# Altium schematic symbol library Regulator_Linear.SchLib: 1538 symbols (part 5 of 9) (continued)
## LT1963AxQ-1.5 (continued)
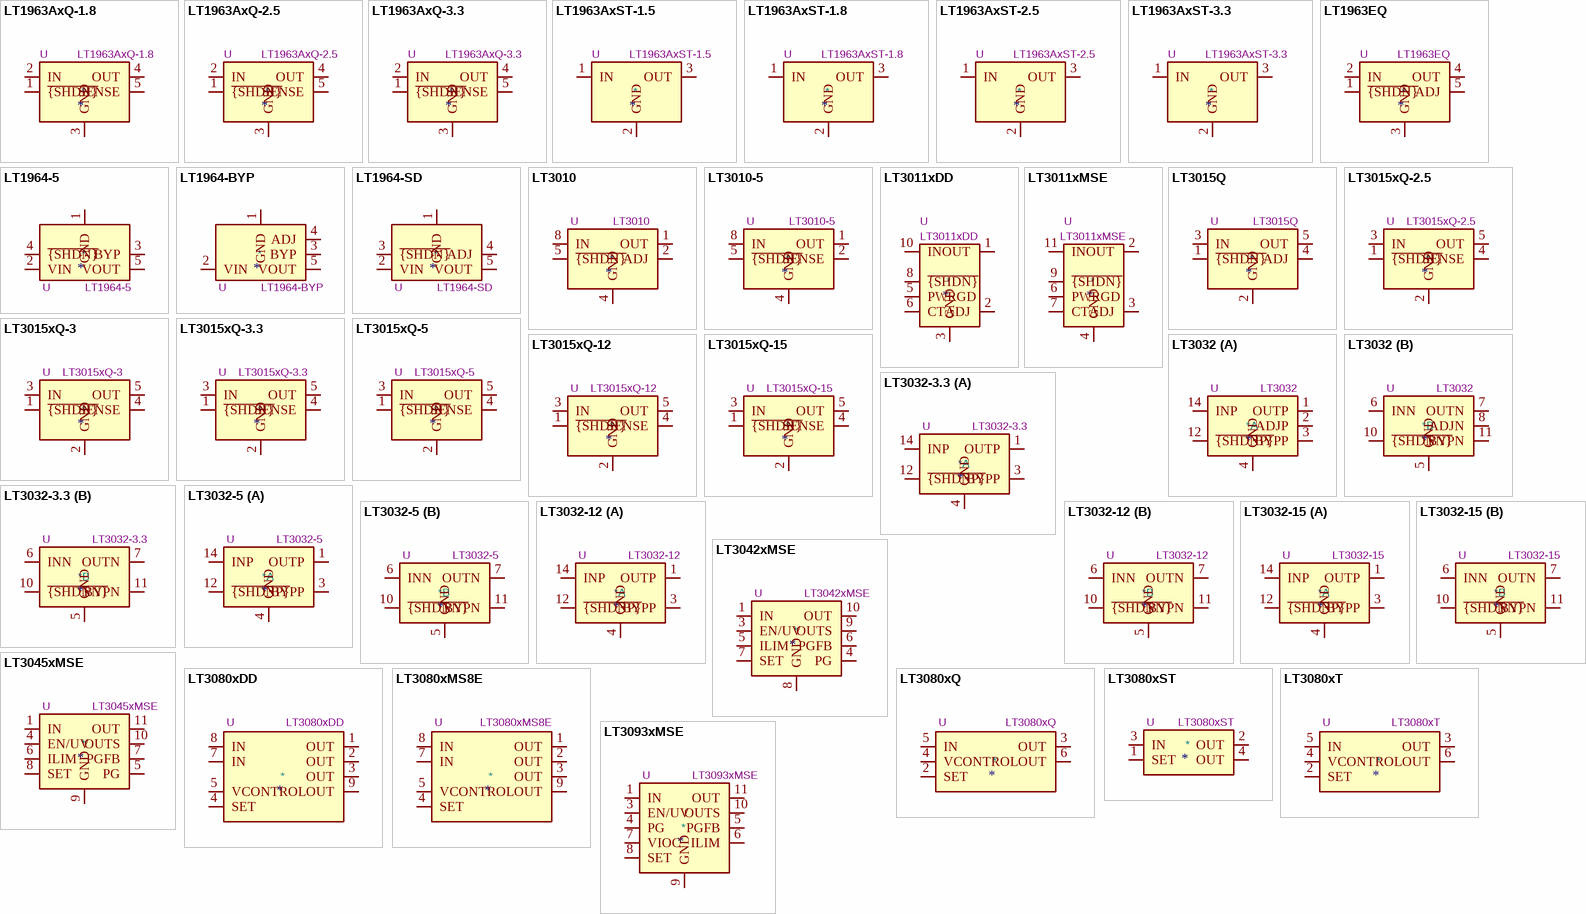
[diagram p20: symbols LT1963AxQ-1.8 to LT3093xMSE]

## LT1963AxQ-1.8
designator *  value LT1963AxQ-1.8  Reference: U
ki_keywords: voltage regulator linear ldo; ki_description: 1.8V, 1.5A, Low Noise, Fast Transient Response LDO Regulator, TO-263-5; ki_fp_filters: TO*263*; Footprint: Package_TO_SOT_SMD:TO-263-5_TabPin3; Datasheet: https://www.analog.com/media/en/technical-documentation/data-sheets/1963aff.pdf
pins: 1 ~{{SHDN}}, 2 IN, 3 GND, 4 OUT, 5 SENSE

## LT1963AxQ-2.5
designator *  value LT1963AxQ-2.5  Reference: U
ki_keywords: voltage regulator linear ldo; ki_description: 2.5V, 1.5A, Low Noise, Fast Transient Response LDO Regulator, TO-263-5; ki_fp_filters: TO*263*; Footprint: Package_TO_SOT_SMD:TO-263-5_TabPin3; Datasheet: https://www.analog.com/media/en/technical-documentation/data-sheets/1963aff.pdf
pins: 1 ~{{SHDN}}, 2 IN, 3 GND, 4 OUT, 5 SENSE

## LT1963AxQ-3.3
designator *  value LT1963AxQ-3.3  Reference: U
ki_keywords: voltage regulator linear ldo; ki_description: 3.3V, 1.5A, Low Noise, Fast Transient Response LDO Regulator, TO-263-5; ki_fp_filters: TO*263*; Footprint: Package_TO_SOT_SMD:TO-263-5_TabPin3; Datasheet: https://www.analog.com/media/en/technical-documentation/data-sheets/1963aff.pdf
pins: 1 ~{{SHDN}}, 2 IN, 3 GND, 4 OUT, 5 SENSE

## LT1963AxST-1.5
designator *  value LT1963AxST-1.5  Reference: U
ki_keywords: LDO voltage regulator fixed; ki_description: 1.5V, 1.5A, Low Noise, Fast Transient Response LDO Regulator, SOT-223; ki_fp_filters: SOT*223*; Footprint: Package_TO_SOT_SMD:SOT-223-3_TabPin2; Datasheet: https://www.analog.com/media/en/technical-documentation/data-sheets/1963aff.pdf
pins: 1 IN, 2 GND, 3 OUT

## LT1963AxST-1.8
designator *  value LT1963AxST-1.8  Reference: U
ki_keywords: LDO voltage regulator fixed; ki_description: 1.8V, 1.5A, Low Noise, Fast Transient Response LDO Regulator, SOT-223; ki_fp_filters: SOT*223*; Footprint: Package_TO_SOT_SMD:SOT-223-3_TabPin2; Datasheet: https://www.analog.com/media/en/technical-documentation/data-sheets/1963aff.pdf
pins: 1 IN, 2 GND, 3 OUT

## LT1963AxST-2.5
designator *  value LT1963AxST-2.5  Reference: U
ki_keywords: LDO voltage regulator fixed; ki_description: 2.5V, 1.5A, Low Noise, Fast Transient Response LDO Regulator, SOT-223; ki_fp_filters: SOT*223*; Footprint: Package_TO_SOT_SMD:SOT-223-3_TabPin2; Datasheet: https://www.analog.com/media/en/technical-documentation/data-sheets/1963aff.pdf
pins: 1 IN, 2 GND, 3 OUT

## LT1963AxST-3.3
designator *  value LT1963AxST-3.3  Reference: U
ki_keywords: LDO voltage regulator fixed; ki_description: 3.3V, 1.5A, Low Noise, Fast Transient Response LDO Regulator, SOT-223; ki_fp_filters: SOT*223*; Footprint: Package_TO_SOT_SMD:SOT-223-3_TabPin2; Datasheet: https://www.analog.com/media/en/technical-documentation/data-sheets/1963aff.pdf
pins: 1 IN, 2 GND, 3 OUT

## LT1963EQ
designator *  value LT1963EQ  Reference: U
ki_keywords: low noise voltage regulator; ki_description: 1.5A, Adjustable, Low Noise, Linear Voltage Regulator, TO-263-5; ki_fp_filters: TO*263*; Footprint: Package_TO_SOT_SMD:TO-263-5_TabPin3; Datasheet: https://www.analog.com/media/en/technical-documentation/data-sheets/1963fc.pdf
pins: 1 ~{{SHDN}}, 2 IN, 3 GND, 4 OUT, 5 ADJ

## LT1964-5
designator *  value LT1964-5  Reference: U
ki_keywords: REGULATOR POSITIVE POWER LDO fixed; ki_description: MICROPOWER 200mA Low Noise LDO negative regulator, fixed output -5V, TSOT-23-5; ki_fp_filters: TSOT?23*; Footprint: Package_TO_SOT_SMD:TSOT-23-5; Datasheet: https://www.analog.com/media/en/technical-documentation/data-sheets/1964fb.pdf
pins: 1 GND, 2 VIN, 3 BYP, 4 ~{{SHDN}}, 5 VOUT

## LT1964-BYP
designator *  value LT1964-BYP  Reference: U
ki_keywords: REGULATOR POSITIVE POWER LDO adjustable; ki_description: MICROPOWER 200mA Low Noise LDO negative regulator, adjustable output, TSOT-23-5; ki_fp_filters: TSOT?23*; Footprint: Package_TO_SOT_SMD:TSOT-23-5; Datasheet: https://www.analog.com/media/en/technical-documentation/data-sheets/1964fb.pdf
pins: 1 GND, 2 VIN, 3 BYP, 4 ADJ, 5 VOUT

## LT1964-SD
designator *  value LT1964-SD  Reference: U
ki_keywords: REGULATOR POSITIVE POWER LDO adjustable; ki_description: MICROPOWER 200mA Low Noise LDO negative regulator, adjustable output, TSOT-23-5; ki_fp_filters: TSOT?23*; Footprint: Package_TO_SOT_SMD:TSOT-23-5; Datasheet: https://www.analog.com/media/en/technical-documentation/data-sheets/1964fb.pdf
pins: 1 GND, 2 VIN, 3 ~{{SHDN}}, 4 ADJ, 5 VOUT

## LT3010
designator *  value LT3010  Reference: U
ki_keywords: REGULATOR POSITIVE POWER LDO adjustable; ki_description: 50mA 3-80V Micropower Low Dropout Regulator, adjustable output, MSOP-8; ki_fp_filters: MSOP*3x3mm*P0.65mm*; Footprint: Package_SO:MSOP-8-1EP_3x3mm_P0.65mm_EP1.68x1.88mm; Datasheet: https://www.analog.com/media/en/technical-documentation/data-sheets/30105fe.pdf
pins: 1 OUT, 2 ADJ, 3 NC hidden, 4 GND, 5 ~{{SHDN}}, 6 NC hidden, 7 NC hidden, 8 IN, 9 GND hidden

## LT3010-5
designator *  value LT3010-5  Reference: U
ki_keywords: REGULATOR POSITIVE POWER LDO fixed; ki_description: 50mA 3-80V Micropower Low Dropout Regulator, fixed output 5V, MSOP-8; ki_fp_filters: MSOP*3x3mm*P0.65mm*; Footprint: Package_SO:MSOP-8-1EP_3x3mm_P0.65mm_EP1.68x1.88mm; Datasheet: https://www.analog.com/media/en/technical-documentation/data-sheets/30105fe.pdf
pins: 1 OUT, 2 SENSE, 3 NC hidden, 4 GND, 5 ~{{SHDN}}, 6 NC hidden, 7 NC hidden, 8 IN, 9 GND hidden

## LT3011xDD
designator *  value LT3011xDD  Reference: U
ki_keywords: variable regulator; ki_description: 50mA, 3V to 80V Low Dropout Micropower Linear Regulator with PWRGD, DFN-10; ki_fp_filters: DFN*1EP*3x3mm*P0.5mm*; Footprint: Package_DFN_QFN:DFN-10-1EP_3x3mm_P0.5mm_EP1.65x2.38mm; Datasheet: https://www.analog.com/media/en/technical-documentation/data-sheets/3011f.pdf
pins: 1 OUT, 2 ADJ, 3 GND, 4 NC hidden, 5 PWRGD, 6 CT, 7 NC hidden, 8 ~{{SHDN}}, 9 NC hidden, 10 IN, 11 GND hidden

## LT3011xMSE
designator *  value LT3011xMSE  Reference: U
ki_keywords: variable regulator; ki_description: 50mA, 3V to 80V Low Dropout Micropower Linear Regulator with PWRGD, MSOP-12; ki_fp_filters: MSOP*1EP*3x4mm*P0.65mm*; Footprint: Package_SO:MSOP-12-1EP_3x4mm_P0.65mm_EP1.65x2.85mm; Datasheet: https://www.analog.com/media/en/technical-documentation/data-sheets/3011f.pdf
pins: 1 NC hidden, 2 OUT, 3 ADJ, 4 GND, 5 NC hidden, 6 PWRGD, 7 CT, 8 NC hidden, 9 ~{{SHDN}}, 10 NC hidden, 11 IN, 12 NC hidden, 13 GND hidden

## LT3015Q
designator *  value LT3015Q  Reference: U
ki_keywords: low noise voltage regulator; ki_description: 1.5A, Adjustable, Low Noise, Negative Voltage Regulator, TO-263-5; ki_fp_filters: TO*263*; Footprint: Package_TO_SOT_SMD:TO-263-5_TabPin3; Datasheet: https://www.analog.com/media/en/technical-documentation/data-sheets/3015fb.pdf
pins: 1 ~{{SHDN}}, 2 GND, 3 IN, 4 ADJ, 5 OUT

## LT3015xQ-2.5
designator *  value LT3015xQ-2.5  Reference: U
ki_keywords: negative voltage regulator; ki_description: -2.5V, 1.5A, Low Noise, Negative Linear Regulator with Precision Current Limit, TO-263-5; ki_fp_filters: TO*263*; Footprint: Package_TO_SOT_SMD:TO-263-5_TabPin3; Datasheet: https://www.analog.com/media/en/technical-documentation/data-sheets/3015fb.pdf
pins: 1 ~{{SHDN}}, 2 GND, 3 IN, 4 SENSE, 5 OUT

## LT3015xQ-3
designator *  value LT3015xQ-3  Reference: U
ki_keywords: negative voltage regulator; ki_description: -3V, 1.5A, Low Noise, Negative Linear Regulator with Precision Current Limit, TO-263-5; ki_fp_filters: TO*263*; Footprint: Package_TO_SOT_SMD:TO-263-5_TabPin3; Datasheet: https://www.analog.com/media/en/technical-documentation/data-sheets/3015fb.pdf
pins: 1 ~{{SHDN}}, 2 GND, 3 IN, 4 SENSE, 5 OUT

## LT3015xQ-3.3
designator *  value LT3015xQ-3.3  Reference: U
ki_keywords: negative voltage regulator; ki_description: -3.3V, 1.5A, Low Noise, Negative Linear Regulator with Precision Current Limit, TO-263-5; ki_fp_filters: TO*263*; Footprint: Package_TO_SOT_SMD:TO-263-5_TabPin3; Datasheet: https://www.analog.com/media/en/technical-documentation/data-sheets/3015fb.pdf
pins: 1 ~{{SHDN}}, 2 GND, 3 IN, 4 SENSE, 5 OUT

## LT3015xQ-5
designator *  value LT3015xQ-5  Reference: U
ki_keywords: negative voltage regulator; ki_description: -5V, 1.5A, Low Noise, Negative Linear Regulator with Precision Current Limit, TO-263-5; ki_fp_filters: TO*263*; Footprint: Package_TO_SOT_SMD:TO-263-5_TabPin3; Datasheet: https://www.analog.com/media/en/technical-documentation/data-sheets/3015fb.pdf
pins: 1 ~{{SHDN}}, 2 GND, 3 IN, 4 SENSE, 5 OUT

## LT3015xQ-12
designator *  value LT3015xQ-12  Reference: U
ki_keywords: negative voltage regulator; ki_description: -12V, 1.5A, Low Noise, Negative Linear Regulator with Precision Current Limit, TO-263-5; ki_fp_filters: TO*263*; Footprint: Package_TO_SOT_SMD:TO-263-5_TabPin3; Datasheet: https://www.analog.com/media/en/technical-documentation/data-sheets/3015fb.pdf
pins: 1 ~{{SHDN}}, 2 GND, 3 IN, 4 SENSE, 5 OUT

## LT3015xQ-15
designator *  value LT3015xQ-15  Reference: U
ki_keywords: negative voltage regulator; ki_description: -15V, 1.5A, Low Noise, Negative Linear Regulator with Precision Current Limit, TO-263-5; ki_fp_filters: TO*263*; Footprint: Package_TO_SOT_SMD:TO-263-5_TabPin3; Datasheet: https://www.analog.com/media/en/technical-documentation/data-sheets/3015fb.pdf
pins: 1 ~{{SHDN}}, 2 GND, 3 IN, 4 SENSE, 5 OUT

## LT3032
designator *  value LT3032  Reference: U
ki_keywords: LDO low noise; ki_description: 150mA, Dual Low Dropout Linear Regulator, Positive/Negative Low Noise, Adjustable Output, DFN-14; ki_fp_filters: Linear*DE14MA*; Footprint: Package_DFN_QFN:Linear_DE14MA; Datasheet: https://www.analog.com/media/en/technical-documentation/data-sheets/3032ff.pdf
part A pins: 1 OUTP, 2 ADJP, 3 BYPP, 4 GND, 12 ~{{SHDNP}}, 13 NC hidden, 14 INP
part B pins: 5 GND, 6 INN, 7 OUTN, 8 ADJN, 9 INN hidden, 10 ~{{SHDNN}}, 11 BYPN

## LT3032-3.3
designator *  value LT3032-3.3  Reference: U
ki_keywords: LDO low noise; ki_description: 150mA, Dual Low Dropout Linear Regulator, Positive/Negative Low Noise, 3.3V Output, DFN-14; ki_fp_filters: Linear*DE14MA*; Footprint: Package_DFN_QFN:Linear_DE14MA; Datasheet: https://www.analog.com/media/en/technical-documentation/data-sheets/3032ff.pdf
part A pins: 1 OUTP, 2 NC hidden, 3 BYPP, 4 GND, 12 ~{{SHDNP}}, 13 NC hidden, 14 INP
part B pins: 5 GND, 6 INN, 7 OUTN, 8 NC hidden, 9 INN hidden, 10 ~{{SHDNN}}, 11 BYPN

## LT3032-5
designator *  value LT3032-5  Reference: U
ki_keywords: LDO low noise; ki_description: 150mA, Dual Low Dropout Linear Regulator, Positive/Negative Low Noise, 5V Output, DFN-14; ki_fp_filters: Linear*DE14MA*; Footprint: Package_DFN_QFN:Linear_DE14MA; Datasheet: https://www.analog.com/media/en/technical-documentation/data-sheets/3032ff.pdf
part A pins: 1 OUTP, 2 NC hidden, 3 BYPP, 4 GND, 12 ~{{SHDNP}}, 13 NC hidden, 14 INP
part B pins: 5 GND, 6 INN, 7 OUTN, 8 NC hidden, 9 INN hidden, 10 ~{{SHDNN}}, 11 BYPN

## LT3032-12
designator *  value LT3032-12  Reference: U
ki_keywords: LDO low noise; ki_description: 150mA, Dual Low Dropout Linear Regulator, Positive/Negative Low Noise, 12V Output, DFN-14; ki_fp_filters: Linear*DE14MA*; Footprint: Package_DFN_QFN:Linear_DE14MA; Datasheet: https://www.analog.com/media/en/technical-documentation/data-sheets/3032ff.pdf
part A pins: 1 OUTP, 2 NC hidden, 3 BYPP, 4 GND, 12 ~{{SHDNP}}, 13 NC hidden, 14 INP
part B pins: 5 GND, 6 INN, 7 OUTN, 8 NC hidden, 9 INN hidden, 10 ~{{SHDNN}}, 11 BYPN

## LT3032-15
designator *  value LT3032-15  Reference: U
ki_keywords: LDO low noise; ki_description: 150mA, Dual Low Dropout Linear Regulator, Positive/Negative Low Noise, 15V Output, DFN-14; ki_fp_filters: Linear*DE14MA*; Footprint: Package_DFN_QFN:Linear_DE14MA; Datasheet: https://www.analog.com/media/en/technical-documentation/data-sheets/3032ff.pdf
part A pins: 1 OUTP, 2 NC hidden, 3 BYPP, 4 GND, 12 ~{{SHDNP}}, 13 NC hidden, 14 INP
part B pins: 5 GND, 6 INN, 7 OUTN, 8 NC hidden, 9 INN hidden, 10 ~{{SHDNN}}, 11 BYPN

## LT3042xMSE
designator *  value LT3042xMSE  Reference: U
ki_keywords: linear voltage regulator low-noise; ki_description: 200mA, Adjustable, Ultralow Noise, Ultrahigh PSRR RF Linear Regulator, MSOP-10; ki_fp_filters: MSOP*1EP*3x3mm*P0.5mm*; Footprint: Package_SO:MSOP-10-1EP_3x3mm_P0.5mm_EP1.68x1.88mm; Datasheet: https://www.analog.com/media/en/technical-documentation/data-sheets/3042fb.pdf
pins: 1 IN, 2 IN hidden, 3 EN/UV, 4 PG, 5 ILIM, 6 PGFB, 7 SET, 8 GND, 9 OUTS, 10 OUT, 11 GND hidden

## LT3045xMSE
designator *  value LT3045xMSE  Reference: U
ki_keywords: linear voltage regulator low-noise; ki_description: 500mA, Adjustable, Ultralow Noise, Ultrahigh PSRR Linear Regulator, MSOP-12; ki_fp_filters: MSOP*1EP*3x4mm*P0.65mm*; Footprint: Package_SO:MSOP-12-1EP_3x4mm_P0.65mm_EP1.65x2.85mm; Datasheet: https://www.analog.com/media/en/technical-documentation/data-sheets/3045fa.pdf
pins: 1 IN, 2 IN hidden, 3 IN hidden, 4 EN/UV, 5 PG, 6 ILIM, 7 PGFB, 8 SET, 9 GND, 10 OUTS, 11 OUT, 12 OUT hidden, 13 GND hidden

## LT3080xDD
designator *  value LT3080xDD  Reference: U
ki_keywords: Adjustable 1.1A Low Dropout Regulator; ki_description: Adjustable 1.1A Single Resistor Low Dropout Regulator, DFN-8; ki_fp_filters: DFN*1EP?3x3mm*P0.5mm*; Footprint: Package_DFN_QFN:DFN-8-1EP_3x3mm_P0.5mm_EP1.66x2.38mm; Datasheet: https://www.analog.com/media/en/technical-documentation/data-sheets/3080fc.pdf
pins: 1 OUT, 2 OUT, 3 OUT, 4 SET, 5 VCONTROL, 6 NC hidden, 7 IN, 8 IN, 9 OUT

## LT3080xMS8E
designator *  value LT3080xMS8E  Reference: U
ki_keywords: Adjustable 1.1A Low Dropout Regulator; ki_description: Adjustable 1.1A Single Resistor Low Dropout Regulator, MSOP-8; ki_fp_filters: MSOP*1EP?3x3mm*P0.65mm*; Footprint: Package_SO:MSOP-8-1EP_3x3mm_P0.65mm_EP1.68x1.88mm; Datasheet: https://www.analog.com/media/en/technical-documentation/data-sheets/3080fc.pdf
pins: 1 OUT, 2 OUT, 3 OUT, 4 SET, 5 VCONTROL, 6 NC hidden, 7 IN, 8 IN, 9 OUT

## LT3080xQ
designator *  value LT3080xQ  Reference: U
ki_keywords: Adjustable 1.1A Low Dropout Regulator; ki_description: Adjustable 1.1A Single Resistor Low Dropout Regulator, TO-220; ki_fp_filters: TO?263*TabPin3*; Footprint: Package_TO_SOT_SMD:TO-263-5_TabPin3; Datasheet: https://www.analog.com/media/en/technical-documentation/data-sheets/3080fc.pdf
pins: 1 NC hidden, 2 SET, 3 OUT, 4 VCONTROL, 5 IN, 6 OUT

## LT3080xST
designator *  value LT3080xST  Reference: U
ki_keywords: Adjustable 1.1A Low Dropout Regulator; ki_description: Adjustable 1.1A Single Resistor Low Dropout Regulator, SOT-223; ki_fp_filters: SOT?223*; Footprint: Package_TO_SOT_SMD:SOT-223; Datasheet: https://www.analog.com/media/en/technical-documentation/data-sheets/3080fc.pdf
pins: 1 SET, 2 OUT, 3 IN, 4 OUT

## LT3080xT
designator *  value LT3080xT  Reference: U
ki_keywords: Adjustable 1.1A Low Dropout Regulator; ki_description: Adjustable 1.1A Single Resistor Low Dropout Regulator, TO-220; ki_fp_filters: TO?220*StaggerOdd*; Footprint: Package_TO_SOT_THT:TO-220-5_P3.4x3.7mm_StaggerOdd_Lead3.8mm_Vertical; Datasheet: https://www.analog.com/media/en/technical-documentation/data-sheets/3080fc.pdf
pins: 1 NC hidden, 2 SET, 3 OUT, 4 VCONTROL, 5 IN, 6 OUT

## LT3093xMSE
designator *  value LT3093xMSE  Reference: U
ki_keywords: linear negative voltage regulator low-noise; ki_description: -200mA, Adjustable, Ultralow Noise, Ultrahigh PSRR RF Negative Linear Regulator, MSOP-12; ki_fp_filters: MSOP*1EP*3x4mm*P0.65mm*; Footprint: Package_SO:MSOP-12-1EP_3x4mm_P0.65mm_EP1.65x2.85mm; Datasheet: https://www.analog.com/media/en/technical-documentation/data-sheets/lt3093.pdf
pins: 1 IN, 2 IN hidden, 3 EN/UV, 4 PG, 5 PGFB, 6 ILIM, 7 VIOC, 8 SET, 9 GND, 10 OUTS, 11 OUT, 12 OUT hidden, 13 IN hidden

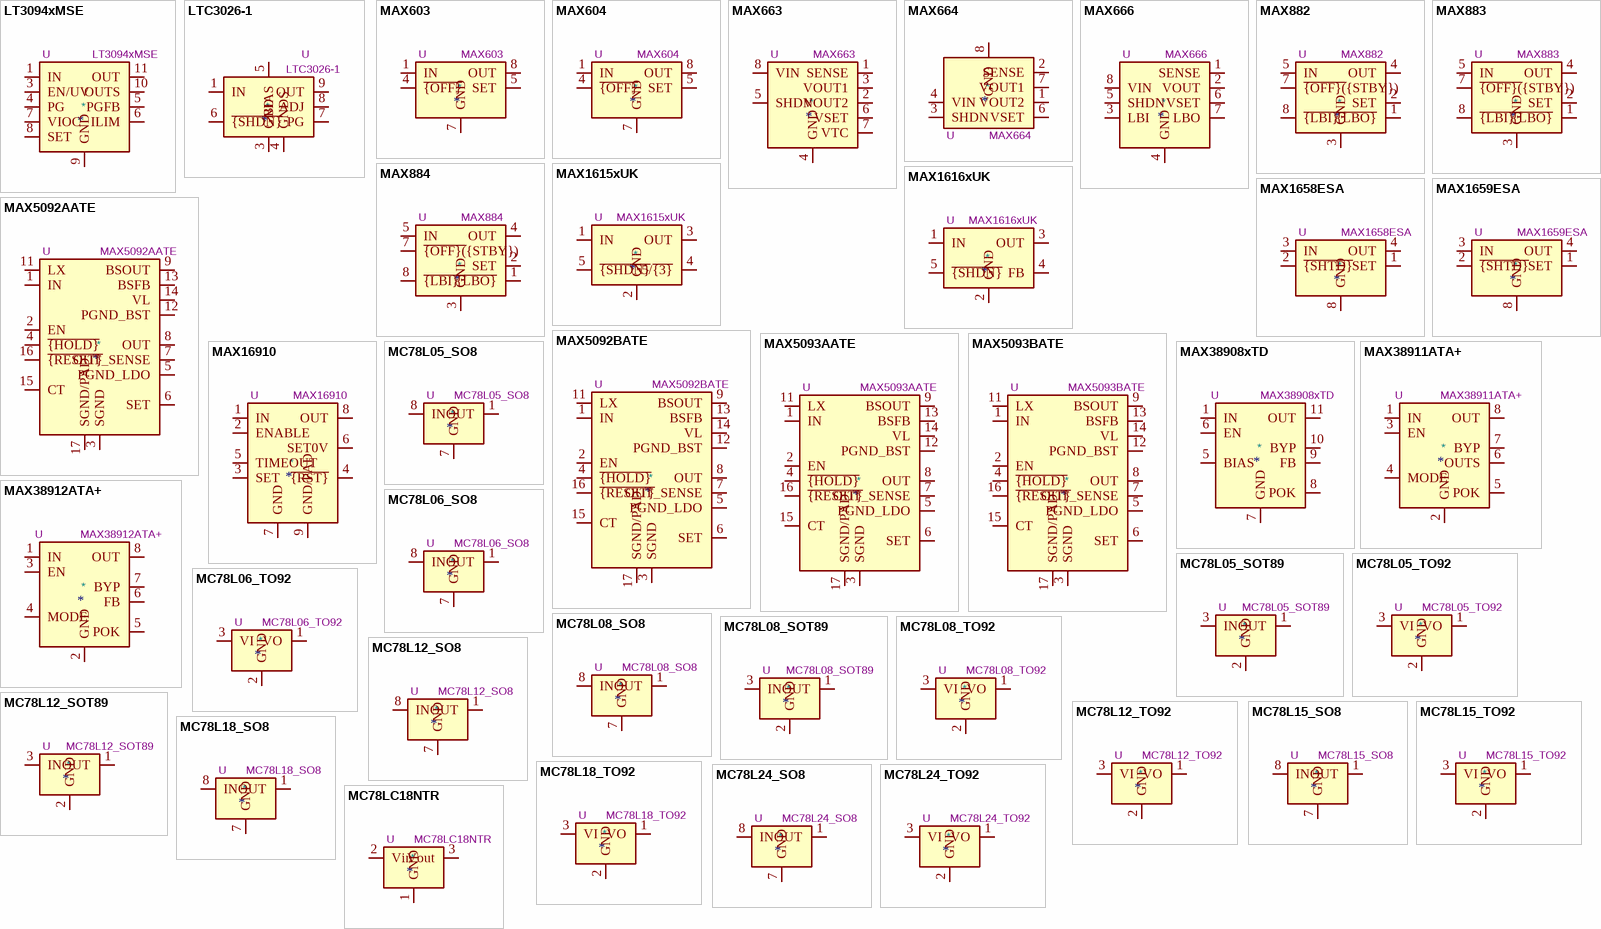
[diagram p21: symbols LT3094xMSE to MC78LC18NTR]

## LT3094xMSE
designator *  value LT3094xMSE  Reference: U
ki_keywords: linear negative voltage regulator low-noise; ki_description: -500mA, Adjustable, Ultralow Noise, Ultrahigh PSRR RF Negative Linear Regulator, MSOP-12; ki_fp_filters: MSOP*1EP*3x4mm*P0.65mm*; Footprint: Package_SO:MSOP-12-1EP_3x4mm_P0.65mm_EP1.65x2.85mm; Datasheet: https://www.analog.com/media/en/technical-documentation/data-sheets/LT3094.pdf
pins: 1 IN, 2 IN hidden, 3 EN/UV, 4 PG, 5 PGFB, 6 ILIM, 7 VIOC, 8 SET, 9 GND, 10 OUTS, 11 OUT, 12 OUT hidden, 13 IN hidden

## LTC3026-1
designator *  value LTC3026-1  Reference: U
ki_keywords: regulator LDO positive adjustable; ki_description: 1.14V-5.5V, 1.5A Low Input Voltage VLDO Linear Regulator; ki_fp_filters: DFN*1EP*3x3mm*P0.5mm*EP1.65x2.38mm* MSOP*1EP*3x3mm*P0.5mm*EP1.68x1.88mm*; Datasheet: https://www.analog.com/media/en/technical-documentation/data-sheets/30261f.pdf
pins: 1 IN, 2 IN hidden, 3 GND, 4 GNDS, 5 BIAS, 6 ~{{SHDN}}, 7 PG, 8 ADJ, 9 OUT, 10 OUT hidden, 11 GND hidden

## MAX603
designator *  value MAX603  Reference: U
ki_keywords: Linear LDO Regulator 500mA 5V fixed; ki_description: 500mA Linear LDO Regulator, Fixed Output 5V, DIP-8/SO-8; ki_fp_filters: DIP*W7.62mm* SOIC*3.9x4.9mm*P1.27mm*; Datasheet: http://datasheets.maximintegrated.com/en/ds/MAX603-MAX604.pdf
pins: 1 IN, 2 GND hidden, 3 GND hidden, 4 ~{{OFF}}, 5 SET, 6 GND hidden, 7 GND, 8 OUT

## MAX604
designator *  value MAX604  Reference: U
ki_keywords: Linear LDO Regulator 500mA 3.3V fixed; ki_description: 500mA Linear LDO Regulator, Fixed Output 3.3V, DIP-8/SO-8; ki_fp_filters: DIP*W7.62mm* SOIC*3.9x4.9mm*P1.27mm*; Datasheet: http://datasheets.maximintegrated.com/en/ds/MAX603-MAX604.pdf
pins: 1 IN, 2 GND hidden, 3 GND hidden, 4 ~{{OFF}}, 5 SET, 6 GND hidden, 7 GND, 8 OUT

## MAX663
designator *  value MAX663  Reference: U
ki_keywords: Linear LDO Regulator 50mA 5V fixed; ki_description: 50mA Dual Mode 5V/Programmable Micropower Voltage Regulator, DIP-8/SO-8; ki_fp_filters: DIP*W7.62mm* SOIC*3.9x4.9mm*P1.27mm*; Datasheet: http://pdfserv.maximintegrated.com/en/ds/MAX663-MAX666.pdf
pins: 1 SENSE, 2 VOUT2, 3 VOUT1, 4 GND, 5 SHDN, 6 VSET, 7 VTC, 8 VIN

## MAX664
designator *  value MAX664  Reference: U
ki_keywords: Linear LDO Regulator 50mA -5V fixed negative; ki_description: 50mA Dual Mode -5V/Programmable Micropower Negative Voltage Regulator, DIP-8/SO-8; ki_fp_filters: DIP*W7.62mm* SOIC*3.9x4.9mm*P1.27mm*; Datasheet: http://pdfserv.maximintegrated.com/en/ds/MAX663-MAX666.pdf
pins: 1 VOUT2, 2 SENSE, 3 SHDN, 4 VIN, 5 SHDN hidden, 6 VSET, 7 VOUT1, 8 GND

## MAX666
designator *  value MAX666  Reference: U
ki_keywords: Linear LDO Regulator 50mA 5V fixed; ki_description: 50mA Dual Mode 5V/Programmable Micropower Voltage Regulator, DIP-8/SO-8; ki_fp_filters: DIP*W7.62mm* SOIC*3.9x4.9mm*P1.27mm*; Datasheet: http://pdfserv.maximintegrated.com/en/ds/MAX663-MAX666.pdf
pins: 1 SENSE, 2 VOUT, 3 LBI, 4 GND, 5 SHDN, 6 VSET, 7 LBO, 8 VIN

## MAX882
designator *  value MAX882  Reference: U
ki_keywords: Linear LDO Regulator; ki_description: 200mA Linear LDO Regulator, Fixed Output 3.3V or Adjustable with Standby Mode, 0C to +70C, DIP-8/SO-8; ki_fp_filters: DIP*W7.62mm* SOIC*3.9x4.9mm*P1.27mm*; Datasheet: https://datasheets.maximintegrated.com/en/ds/MAX882-MAX884.pdf
pins: 1 ~{{LBO}}, 2 SET, 3 GND, 4 OUT, 5 IN, 6 GND hidden, 7 ~{{OFF}(}{STBY}), 8 ~{{LBI}}

## MAX883
designator *  value MAX883  Reference: U
ki_keywords: Linear LDO Regulator; ki_description: 200mA Linear LDO Regulator, Fixed Output 5V or Adjustable with Shutdown Mode, 0C to +70C, DIP-8/SO-8; ki_fp_filters: DIP*W7.62mm* SOIC*3.9x4.9mm*P1.27mm*; Datasheet: https://datasheets.maximintegrated.com/en/ds/MAX882-MAX884.pdf
pins: 1 ~{{LBO}}, 2 SET, 3 GND, 4 OUT, 5 IN, 6 GND hidden, 7 ~{{OFF}(}{STBY}), 8 ~{{LBI}}

## MAX884
designator *  value MAX884  Reference: U
ki_keywords: Linear LDO Regulator; ki_description: 200mA Linear LDO Regulator, Fixed Output 3.3V or Adjustable with Shutdown Mode, 0C to +70C, DIP-8/SO-8; ki_fp_filters: DIP*W7.62mm* SOIC*3.9x4.9mm*P1.27mm*; Datasheet: https://datasheets.maximintegrated.com/en/ds/MAX882-MAX884.pdf
pins: 1 ~{{LBO}}, 2 SET, 3 GND, 4 OUT, 5 IN, 6 GND hidden, 7 ~{{OFF}(}{STBY}), 8 ~{{LBI}}

## MAX1615xUK
designator *  value MAX1615xUK  Reference: U
ki_keywords: Linear Voltage Regulator; ki_description: High Voltage, Low Power Linear Regulator for Notebook PCs - 3.3V or 5V Fixed; ki_fp_filters: SOT?23?5*; Footprint: Package_TO_SOT_SMD:SOT-23-5; Datasheet: https://datasheets.maximintegrated.com/en/ds/MAX1615-MAX1616.pdf
pins: 1 IN, 2 GND, 3 OUT, 4 5/~{{3}}, 5 ~{{SHDN}}

## MAX1616xUK
designator *  value MAX1616xUK  Reference: U
ki_keywords: Linear Voltage Regulator; ki_description: High Voltage, Low Power Linear Regulator for Notebook PCs - Adjustable; ki_fp_filters: SOT?23?5*; Footprint: Package_TO_SOT_SMD:SOT-23-5; Datasheet: https://datasheets.maximintegrated.com/en/ds/MAX1615-MAX1616.pdf
pins: 1 IN, 2 GND, 3 OUT, 4 FB, 5 ~{{SHDN}}

## MAX1658ESA
designator *  value MAX1658ESA  Reference: U
ki_keywords: Linear LDO Regulator 350mA 3.3V; ki_description: 350mA Linear LDO Regulator, Fixed Output 3.3V, SO-8; ki_fp_filters: SOIC*3.9x4.9mm*P1.27mm*; Footprint: Package_SO:SOIC-8_3.9x4.9mm_P1.27mm; Datasheet: http://datasheets.maximintegrated.com/en/ds/MAX1658-MAX1659.pdf
pins: 1 SET, 2 ~{{SHTD}}, 3 IN, 4 OUT, 5 OUT hidden, 6 IN hidden, 7 IN hidden, 8 GND

## MAX1659ESA
designator *  value MAX1659ESA  Reference: U
ki_keywords: Linear LDO Regulator 350mA 5V; ki_description: 350mA Linear LDO Regulator, Fixed Output 5V, SO-8; ki_fp_filters: SOIC*3.9x4.9mm*P1.27mm*; Footprint: Package_SO:SOIC-8_3.9x4.9mm_P1.27mm; Datasheet: http://datasheets.maximintegrated.com/en/ds/MAX1658-MAX1659.pdf
pins: 1 SET, 2 ~{{SHTD}}, 3 IN, 4 OUT, 5 OUT hidden, 6 IN hidden, 7 IN hidden, 8 GND

## MAX5092AATE
designator *  value MAX5092AATE  Reference: U
ki_keywords: High Voltage 72V Input LDO Boost Preregulator 250mA 3.3V; ki_description: 4V to 72V Input LDOs with Boost Preregulator, 250mA Output, 3.3V Preset Vout, TQFN-16; ki_fp_filters: QFN*5x5mm*P0.8mm*; Footprint: Package_DFN_QFN:QFN-16-1EP_5x5mm_P0.8mm_EP2.7x2.7mm; Datasheet: http://datasheets.maximintegrated.com/en/ds/MAX5092-MAX5093.pdf
pins: 1 IN, 2 EN, 3 SGND, 4 ~{{HOLD}}, 5 PGND_LDO, 6 SET, 7 OUT_SENSE, 8 OUT, 9 BSOUT, 10 LX hidden, 11 LX, 12 PGND_BST, 13 BSFB, 14 VL, 15 CT, 16 ~{{RESET}}, 17 SGND/PAD

## MAX5092BATE
designator *  value MAX5092BATE  Reference: U
ki_keywords: High Voltage 72V Input LDO Boost Preregulator 250mA 5V; ki_description: 4V to 72V Input LDOs with Boost Preregulator, 250mA Output, 5V Preset Vout, TQFN-16; ki_fp_filters: QFN*5x5mm*P0.8mm*; Footprint: Package_DFN_QFN:QFN-16-1EP_5x5mm_P0.8mm_EP2.7x2.7mm; Datasheet: http://datasheets.maximintegrated.com/en/ds/MAX5092-MAX5093.pdf
pins: 1 IN, 2 EN, 3 SGND, 4 ~{{HOLD}}, 5 PGND_LDO, 6 SET, 7 OUT_SENSE, 8 OUT, 9 BSOUT, 10 LX hidden, 11 LX, 12 PGND_BST, 13 BSFB, 14 VL, 15 CT, 16 ~{{RESET}}, 17 SGND/PAD

## MAX5093AATE
designator *  value MAX5093AATE  Reference: U
ki_keywords: High Voltage 72V Input LDO Boost Preregulator 250mA 3.3V; ki_description: 4V to 72V Input LDOs with Boost Preregulator, 250mA Output, 3.3V Preset Vout, TQFN-16; ki_fp_filters: QFN*5x5mm*P0.8mm*; Footprint: Package_DFN_QFN:QFN-16-1EP_5x5mm_P0.8mm_EP2.7x2.7mm; Datasheet: http://datasheets.maximintegrated.com/en/ds/MAX5092-MAX5093.pdf
pins: 1 IN, 2 EN, 3 SGND, 4 ~{{HOLD}}, 5 PGND_LDO, 6 SET, 7 OUT_SENSE, 8 OUT, 9 BSOUT, 10 LX hidden, 11 LX, 12 PGND_BST, 13 BSFB, 14 VL, 15 CT, 16 ~{{RESET}}, 17 SGND/PAD

## MAX5093BATE
designator *  value MAX5093BATE  Reference: U
ki_keywords: High Voltage 72V Input LDO Boost Preregulator 250mA 5V; ki_description: 4V to 72V Input LDOs with Boost Preregulator, 250mA Output, 5V Preset Vout, TQFN-16; ki_fp_filters: QFN*5x5mm*P0.8mm*; Footprint: Package_DFN_QFN:QFN-16-1EP_5x5mm_P0.8mm_EP2.7x2.7mm; Datasheet: http://datasheets.maximintegrated.com/en/ds/MAX5092-MAX5093.pdf
pins: 1 IN, 2 EN, 3 SGND, 4 ~{{HOLD}}, 5 PGND_LDO, 6 SET, 7 OUT_SENSE, 8 OUT, 9 BSOUT, 10 LX hidden, 11 LX, 12 PGND_BST, 13 BSFB, 14 VL, 15 CT, 16 ~{{RESET}}, 17 SGND/PAD

## MAX16910
designator *  value MAX16910  Reference: U
ki_keywords: Linear LDO Regulator; ki_description: 200mA Automotive Linear LDO Regulator, Fixed Output 5V/3.3V or Adjustable, SO-8/DFN-8; ki_fp_filters: SOIC*3.9x4.9mm*P1.27mm* DFN*3x3mm*P0.65mm*; Datasheet: https://datasheets.maximintegrated.com/en/ds/MAX16910.pdf
pins: 1 IN, 2 ENABLE, 3 SET, 4 ~{{RST}}, 5 TIMEOUT, 6 SET0V, 7 GND, 8 OUT, 9 GND/PAD

## MAX38908xTD
designator *  value MAX38908xTD  Reference: U
ki_keywords: Linear LDO Regulator Maxim Analog Devices; ki_description: 4A, High-Performance LDO Linear Regulator, 0.9V-5.5Vin, 0.6V-5Vout, 2.7V-20Vbias, TDFN-14; ki_fp_filters: *TDFN*1EP*3x3mm*P0.4mm*; Footprint: Package_DFN_QFN:TDFN-14-1EP_3x3mm_P0.4mm_EP1.78x2.35mm; Datasheet: https://www.analog.com/media/en/technical-documentation/data-sheets/MAX38907-MAX38908.pdf
pins: 1 IN, 2 IN hidden, 3 IN hidden, 4 IN hidden, 5 BIAS, 6 EN, 7 GND, 8 POK, 9 FB, 10 BYP, 11 OUT, 12 OUT hidden, 13 OUT hidden, 14 OUT hidden, 15 GND hidden

## MAX38911ATA+
designator *  value MAX38911ATA+  Reference: U
ki_keywords: Linear LDO Regulator Maxim Analog Devices; ki_description: 11μVRMS Low-Noise, 500mA LDO Linear Regulator with Low-Power Mode, 2V-5.5Vin, 1.8Vout, TDFN-8; ki_fp_filters: *TDFN*1EP*2x2mm*P0.5mm*; Footprint: Package_DFN_QFN:TDFN-8-1EP_2x2mm_P0.5mm_EP0.8x1.2mm; Datasheet: https://www.analog.com/media/en/technical-documentation/data-sheets/MAX38911-MAX38912.pdf
pins: 1 IN, 2 GND, 3 EN, 4 MODE, 5 POK, 6 OUTS, 7 BYP, 8 OUT, 9 GND hidden

## MAX38912ATA+
designator *  value MAX38912ATA+  Reference: U
ki_keywords: Linear LDO Regulator Maxim Analog Devices; ki_description: 11μVRMS Low-Noise, 500mA LDO Linear Regulator with Low-Power Mode, 1.7V-5.5Vin, 0.8V-5Vout, TDFN-8; ki_fp_filters: *TDFN*1EP*2x2mm*P0.5mm*; Footprint: Package_DFN_QFN:TDFN-8-1EP_2x2mm_P0.5mm_EP0.8x1.2mm; Datasheet: https://www.analog.com/media/en/technical-documentation/data-sheets/MAX38911-MAX38912.pdf
pins: 1 IN, 2 GND, 3 EN, 4 MODE, 5 POK, 6 FB, 7 BYP, 8 OUT, 9 GND hidden

## MC78L05_SO8
designator *  value MC78L05_SO8  Reference: U
ki_keywords: Voltage Regulator 100mA Positive; ki_description: Positive 100mA 30V Linear Regulator, Fixed Output 5V, SO-8; ki_fp_filters: SOIC*3.9x4.9mm*P1.27mm*; Footprint: Package_SO:SOIC-8_3.9x4.9mm_P1.27mm; Datasheet: https://www.onsemi.com/pub/Collateral/MC78L00A-D.PDF
pins: 1 OUT, 2 GND hidden, 3 GND hidden, 4 NC hidden, 5 NC hidden, 6 GND hidden, 7 GND, 8 IN

## MC78L05_SOT89
designator *  value MC78L05_SOT89  Reference: U
ki_keywords: Voltage Regulator 100mA Positive; ki_description: Positive 100mA 30V Linear Regulator, Fixed Output 5V, SOT-89; ki_fp_filters: SOT?89*; Footprint: Package_TO_SOT_SMD:SOT-89-3; Datasheet: https://www.onsemi.com/pub/Collateral/MC78L00A-D.PDF
pins: 1 OUT, 2 GND, 3 IN

## MC78L05_TO92
designator *  value MC78L05_TO92  Reference: U
ki_keywords: Voltage Regulator 100mA Positive; ki_description: Positive 100mA 30V Linear Regulator, Fixed Output 5V, TO-92; ki_fp_filters: TO?92*; Footprint: Package_TO_SOT_THT:TO-92_Inline; Datasheet: https://www.onsemi.com/pub/Collateral/MC78L00A-D.PDF
pins: 1 VO, 2 GND, 3 VI

## MC78L06_SO8
designator *  value MC78L06_SO8  Reference: U
ki_keywords: Voltage Regulator 100mA Positive; ki_description: Positive 100mA 30V Linear Regulator, Fixed Output 6V, SO-8; ki_fp_filters: SOIC*3.9x4.9mm*P1.27mm*; Footprint: Package_SO:SOIC-8_3.9x4.9mm_P1.27mm; Datasheet: https://www.onsemi.com/pub/Collateral/MC78L00A-D.PDF
pins: 1 OUT, 2 GND hidden, 3 GND hidden, 4 NC hidden, 5 NC hidden, 6 GND hidden, 7 GND, 8 IN

## MC78L06_TO92
designator *  value MC78L06_TO92  Reference: U
ki_keywords: Voltage Regulator 100mA Positive; ki_description: Positive 100mA 30V Linear Regulator, Fixed Output 6V, TO-92; ki_fp_filters: TO?92*; Footprint: Package_TO_SOT_THT:TO-92_Inline; Datasheet: https://www.onsemi.com/pub/Collateral/MC78L00A-D.PDF
pins: 1 VO, 2 GND, 3 VI

## MC78L08_SO8
designator *  value MC78L08_SO8  Reference: U
ki_keywords: Voltage Regulator 100mA Positive; ki_description: Positive 100mA 30V Linear Regulator, Fixed Output 8V, SO-8; ki_fp_filters: SOIC*3.9x4.9mm*P1.27mm*; Footprint: Package_SO:SOIC-8_3.9x4.9mm_P1.27mm; Datasheet: https://www.onsemi.com/pub/Collateral/MC78L00A-D.PDF
pins: 1 OUT, 2 GND hidden, 3 GND hidden, 4 NC hidden, 5 NC hidden, 6 GND hidden, 7 GND, 8 IN

## MC78L08_SOT89
designator *  value MC78L08_SOT89  Reference: U
ki_keywords: Voltage Regulator 100mA Positive; ki_description: Positive 100mA 30V Linear Regulator, Fixed Output 8V, SOT-89; ki_fp_filters: SOT?89*; Footprint: Package_TO_SOT_SMD:SOT-89-3; Datasheet: https://www.onsemi.com/pub/Collateral/MC78L00A-D.PDF
pins: 1 OUT, 2 GND, 3 IN

## MC78L08_TO92
designator *  value MC78L08_TO92  Reference: U
ki_keywords: Voltage Regulator 100mA Positive; ki_description: Positive 100mA 30V Linear Regulator, Fixed Output 8V, TO-92; ki_fp_filters: TO?92*; Footprint: Package_TO_SOT_THT:TO-92_Inline; Datasheet: https://www.onsemi.com/pub/Collateral/MC78L00A-D.PDF
pins: 1 VO, 2 GND, 3 VI

## MC78L12_SO8
designator *  value MC78L12_SO8  Reference: U
ki_keywords: Voltage Regulator 100mA Positive; ki_description: Positive 100mA 30V Linear Regulator, Fixed Output 12V, SO-8; ki_fp_filters: SOIC*3.9x4.9mm*P1.27mm*; Footprint: Package_SO:SOIC-8_3.9x4.9mm_P1.27mm; Datasheet: https://www.onsemi.com/pub/Collateral/MC78L00A-D.PDF
pins: 1 OUT, 2 GND hidden, 3 GND hidden, 4 NC hidden, 5 NC hidden, 6 GND hidden, 7 GND, 8 IN

## MC78L12_SOT89
designator *  value MC78L12_SOT89  Reference: U
ki_keywords: Voltage Regulator 100mA Positive; ki_description: Positive 100mA 30V Linear Regulator, Fixed Output 12V, SOT-89; ki_fp_filters: SOT?89*; Footprint: Package_TO_SOT_SMD:SOT-89-3; Datasheet: https://www.onsemi.com/pub/Collateral/MC78L00A-D.PDF
pins: 1 OUT, 2 GND, 3 IN

## MC78L12_TO92
designator *  value MC78L12_TO92  Reference: U
ki_keywords: Voltage Regulator 100mA Positive; ki_description: Positive 100mA 30V Linear Regulator, Fixed Output 12V, TO-92; ki_fp_filters: TO?92*; Footprint: Package_TO_SOT_THT:TO-92_Inline; Datasheet: https://www.onsemi.com/pub/Collateral/MC78L00A-D.PDF
pins: 1 VO, 2 GND, 3 VI

## MC78L15_SO8
designator *  value MC78L15_SO8  Reference: U
ki_keywords: Voltage Regulator 100mA Positive; ki_description: Positive 100mA 30V Linear Regulator, Fixed Output 15V, SO-8; ki_fp_filters: SOIC*3.9x4.9mm*P1.27mm*; Footprint: Package_SO:SOIC-8_3.9x4.9mm_P1.27mm; Datasheet: https://www.onsemi.com/pub/Collateral/MC78L00A-D.PDF
pins: 1 OUT, 2 GND hidden, 3 GND hidden, 4 NC hidden, 5 NC hidden, 6 GND hidden, 7 GND, 8 IN

## MC78L15_TO92
designator *  value MC78L15_TO92  Reference: U
ki_keywords: Voltage Regulator 100mA Positive; ki_description: Positive 100mA 30V Linear Regulator, Fixed Output 15V, TO-92; ki_fp_filters: TO?92*; Footprint: Package_TO_SOT_THT:TO-92_Inline; Datasheet: https://www.onsemi.com/pub/Collateral/MC78L00A-D.PDF
pins: 1 VO, 2 GND, 3 VI

## MC78L18_SO8
designator *  value MC78L18_SO8  Reference: U
ki_keywords: Voltage Regulator 100mA Positive; ki_description: Positive 100mA 30V Linear Regulator, Fixed Output 18V, SO-8; ki_fp_filters: SOIC*3.9x4.9mm*P1.27mm*; Footprint: Package_SO:SOIC-8_3.9x4.9mm_P1.27mm; Datasheet: http://pdf.datasheetcatalog.com/datasheet/vishay/mc78l00.pdf
pins: 1 OUT, 2 GND hidden, 3 GND hidden, 4 NC hidden, 5 NC hidden, 6 GND hidden, 7 GND, 8 IN

## MC78L18_TO92
designator *  value MC78L18_TO92  Reference: U
ki_keywords: Voltage Regulator 100mA Positive; ki_description: Positive 100mA 30V Linear Regulator, Fixed Output 18V, TO-92; ki_fp_filters: TO?92*; Footprint: Package_TO_SOT_THT:TO-92_Inline; Datasheet: http://pdf.datasheetcatalog.com/datasheet/vishay/mc78l00.pdf
pins: 1 VO, 2 GND, 3 VI

## MC78L24_SO8
designator *  value MC78L24_SO8  Reference: U
ki_keywords: Voltage Regulator 100mA Positive; ki_description: Positive 100mA 30V Linear Regulator, Fixed Output 24V, SO-8; ki_fp_filters: SOIC*3.9x4.9mm*P1.27mm*; Footprint: Package_SO:SOIC-8_3.9x4.9mm_P1.27mm; Datasheet: http://pdf.datasheetcatalog.com/datasheet/vishay/mc78l00.pdf
pins: 1 OUT, 2 GND hidden, 3 GND hidden, 4 NC hidden, 5 NC hidden, 6 GND hidden, 7 GND, 8 IN

## MC78L24_TO92
designator *  value MC78L24_TO92  Reference: U
ki_keywords: Voltage Regulator 100mA Positive; ki_description: Positive 100mA 30V Linear Regulator, Fixed Output 24V, TO-92; ki_fp_filters: TO?92*; Footprint: Package_TO_SOT_THT:TO-92_Inline; Datasheet: http://pdf.datasheetcatalog.com/datasheet/vishay/mc78l00.pdf
pins: 1 VO, 2 GND, 3 VI

## MC78LC18NTR
designator *  value MC78LC18NTR  Reference: U
ki_keywords: Voltage Regulator 50mA Positive; ki_description: Positive 50mA 12V Linear Regulator, Fixed Output 1.8V, SOT23-5; ki_fp_filters: SOT?23*; Footprint: Package_TO_SOT_SMD:SOT-23-5; Datasheet: https://www.onsemi.com/pdf/datasheet/mc78lc00-d.pdf
pins: 1 GND, 2 Vin, 3 Vout, 4 NC hidden, 5 NC hidden

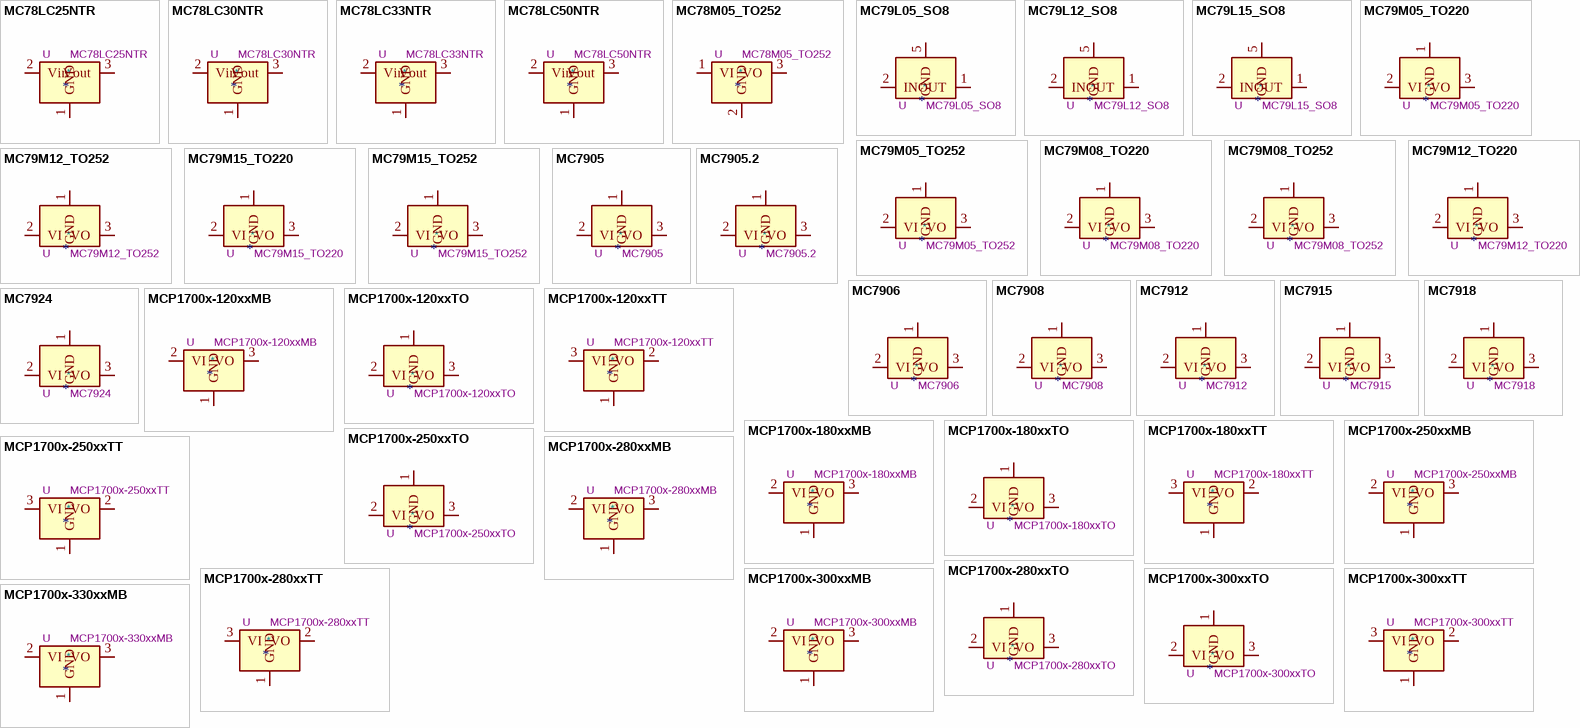
[diagram p22: symbols MC78LC25NTR to MCP1700x-330xxMB]

## MC78LC25NTR
designator *  value MC78LC25NTR  Reference: U
ki_keywords: Voltage Regulator 80mA Positive; ki_description: Positive 80mA 12V Linear Regulator, Fixed Output 2.5V, SOT23-5; ki_fp_filters: SOT?23*; Footprint: Package_TO_SOT_SMD:SOT-23-5; Datasheet: https://www.onsemi.com/pdf/datasheet/mc78lc00-d.pdf
pins: 1 GND, 2 Vin, 3 Vout, 4 NC hidden, 5 NC hidden

## MC78LC30NTR
designator *  value MC78LC30NTR  Reference: U
ki_keywords: Voltage Regulator 80mA Positive; ki_description: Positive 80mA 12V Linear Regulator, Fixed Output 3V, SOT23-5; ki_fp_filters: SOT?23*; Footprint: Package_TO_SOT_SMD:SOT-23-5; Datasheet: https://www.onsemi.com/pdf/datasheet/mc78lc00-d.pdf
pins: 1 GND, 2 Vin, 3 Vout, 4 NC hidden, 5 NC hidden

## MC78LC33NTR
designator *  value MC78LC33NTR  Reference: U
ki_keywords: Voltage Regulator 80mA Positive; ki_description: Positive 80mA 12V Linear Regulator, Fixed Output 3.3V, SOT23-5; ki_fp_filters: SOT?23*; Footprint: Package_TO_SOT_SMD:SOT-23-5; Datasheet: https://www.onsemi.com/pdf/datasheet/mc78lc00-d.pdf
pins: 1 GND, 2 Vin, 3 Vout, 4 NC hidden, 5 NC hidden

## MC78LC50NTR
designator *  value MC78LC50NTR  Reference: U
ki_keywords: Voltage Regulator 100mA Positive; ki_description: Positive 100mA 12V Linear Regulator, Fixed Output 5V, SOT23-5; ki_fp_filters: SOT?23*; Footprint: Package_TO_SOT_SMD:SOT-23-5; Datasheet: https://www.onsemi.com/pdf/datasheet/mc78lc00-d.pdf
pins: 1 GND, 2 Vin, 3 Vout, 4 NC hidden, 5 NC hidden

## MC78M05_TO252
designator *  value MC78M05_TO252  Reference: U
ki_keywords: Voltage Regulator 500mA Positive; ki_description: Positive 500mA 35V Linear Regulator, Fixed Output 5V, TO-252 (D-PAK); ki_fp_filters: TO?252*; Footprint: Package_TO_SOT_SMD:TO-252-2; Datasheet: https://www.onsemi.com/pub/Collateral/MC78M00-D.PDF
pins: 1 VI, 2 GND, 3 VO

## MC79L05_SO8
designator *  value MC79L05_SO8  Reference: U
ki_keywords: Voltage Regulator 100mA Negative; ki_description: Negative 100mA -30V Linear Regulator, Fixed Output -5V, SO-8; ki_fp_filters: SOIC?8*3.9x4.9mm*P1.27mm*; Footprint: Package_SO:SOIC-8_3.9x4.9mm_P1.27mm; Datasheet: http://www.ti.com/lit/ds/symlink/lm79l.pdf
pins: 1 OUT, 2 IN, 3 IN hidden, 4 NC hidden, 5 GND, 6 IN hidden, 7 IN hidden, 8 NC hidden

## MC79L12_SO8
designator *  value MC79L12_SO8  Reference: U
ki_keywords: Voltage Regulator 100mA Negative; ki_description: Negative 100mA -35V Linear Regulator, Fixed Output -12V, SO-8; ki_fp_filters: SOIC?8*3.9x4.9mm*P1.27mm*; Footprint: Package_SO:SOIC-8_3.9x4.9mm_P1.27mm; Datasheet: http://www.ti.com/lit/ds/symlink/lm79l.pdf
pins: 1 OUT, 2 IN, 3 IN hidden, 4 NC hidden, 5 GND, 6 IN hidden, 7 IN hidden, 8 NC hidden

## MC79L15_SO8
designator *  value MC79L15_SO8  Reference: U
ki_keywords: Voltage Regulator 100mA Negative; ki_description: Negative 100mA -35V Linear Regulator, Fixed Output -15V, SO-8; ki_fp_filters: SOIC?8*3.9x4.9mm*P1.27mm*; Footprint: Package_SO:SOIC-8_3.9x4.9mm_P1.27mm; Datasheet: http://www.ti.com/lit/ds/symlink/lm79l.pdf
pins: 1 OUT, 2 IN, 3 IN hidden, 4 NC hidden, 5 GND, 6 IN hidden, 7 IN hidden, 8 NC hidden

## MC79M05_TO220
designator *  value MC79M05_TO220  Reference: U
ki_keywords: Voltage Regulator 500mA Negative; ki_description: Negative 500mA 35V Linear Regulator, Fixed Output -5V, TO-220; ki_fp_filters: TO?220*; Footprint: Package_TO_SOT_THT:TO-220-3_Vertical; Datasheet: http://www.onsemi.com/pub/Collateral/MC79M00-D.PDF
pins: 1 GND, 2 VI, 3 VO

## MC79M05_TO252
designator *  value MC79M05_TO252  Reference: U
ki_keywords: Voltage Regulator 500mA Negative; ki_description: Negative 500mA 35V Linear Regulator, Fixed Output -5V, TO-252; ki_fp_filters: TO?252*; Footprint: Package_TO_SOT_SMD:TO-252-2; Datasheet: http://www.onsemi.com/pub/Collateral/MC79M00-D.PDF
pins: 1 GND, 2 VI, 3 VO

## MC79M08_TO220
designator *  value MC79M08_TO220  Reference: U
ki_keywords: Voltage Regulator 500mA Negative; ki_description: Negative 500mA 35V Linear Regulator, Fixed Output -8V, TO-220; ki_fp_filters: TO?220*; Footprint: Package_TO_SOT_THT:TO-220-3_Vertical; Datasheet: http://www.onsemi.com/pub/Collateral/MC79M00-D.PDF
pins: 1 GND, 2 VI, 3 VO

## MC79M08_TO252
designator *  value MC79M08_TO252  Reference: U
ki_keywords: Voltage Regulator 500mA Negative; ki_description: Negative 500mA 35V Linear Regulator, Fixed Output -8V, TO-252; ki_fp_filters: TO?252*; Footprint: Package_TO_SOT_SMD:TO-252-2; Datasheet: http://www.onsemi.com/pub/Collateral/MC79M00-D.PDF
pins: 1 GND, 2 VI, 3 VO

## MC79M12_TO220
designator *  value MC79M12_TO220  Reference: U
ki_keywords: Voltage Regulator 500mA Negative; ki_description: Negative 500mA 35V Linear Regulator, Fixed Output -12V, TO-220; ki_fp_filters: TO?220*; Footprint: Package_TO_SOT_THT:TO-220-3_Vertical; Datasheet: http://www.onsemi.com/pub/Collateral/MC79M00-D.PDF
pins: 1 GND, 2 VI, 3 VO

## MC79M12_TO252
designator *  value MC79M12_TO252  Reference: U
ki_keywords: Voltage Regulator 500mA Negative; ki_description: Negative 500mA 35V Linear Regulator, Fixed Output -12V, TO-252; ki_fp_filters: TO?252*; Footprint: Package_TO_SOT_SMD:TO-252-2; Datasheet: http://www.onsemi.com/pub/Collateral/MC79M00-D.PDF
pins: 1 GND, 2 VI, 3 VO